# Altium footprint library LED.PcbLib: 71 footprints (part 4 of 5)
Each footprint in its own frame and in the unit in brackets; x right, y up, seen from the top. Pads: shape width x height; smd on the part's side, far side on the other; paste and mask are expansions set on the pad; w line width, h text height; cw(c..) or ccw(c..) is an arc to the next point about the centre after c.
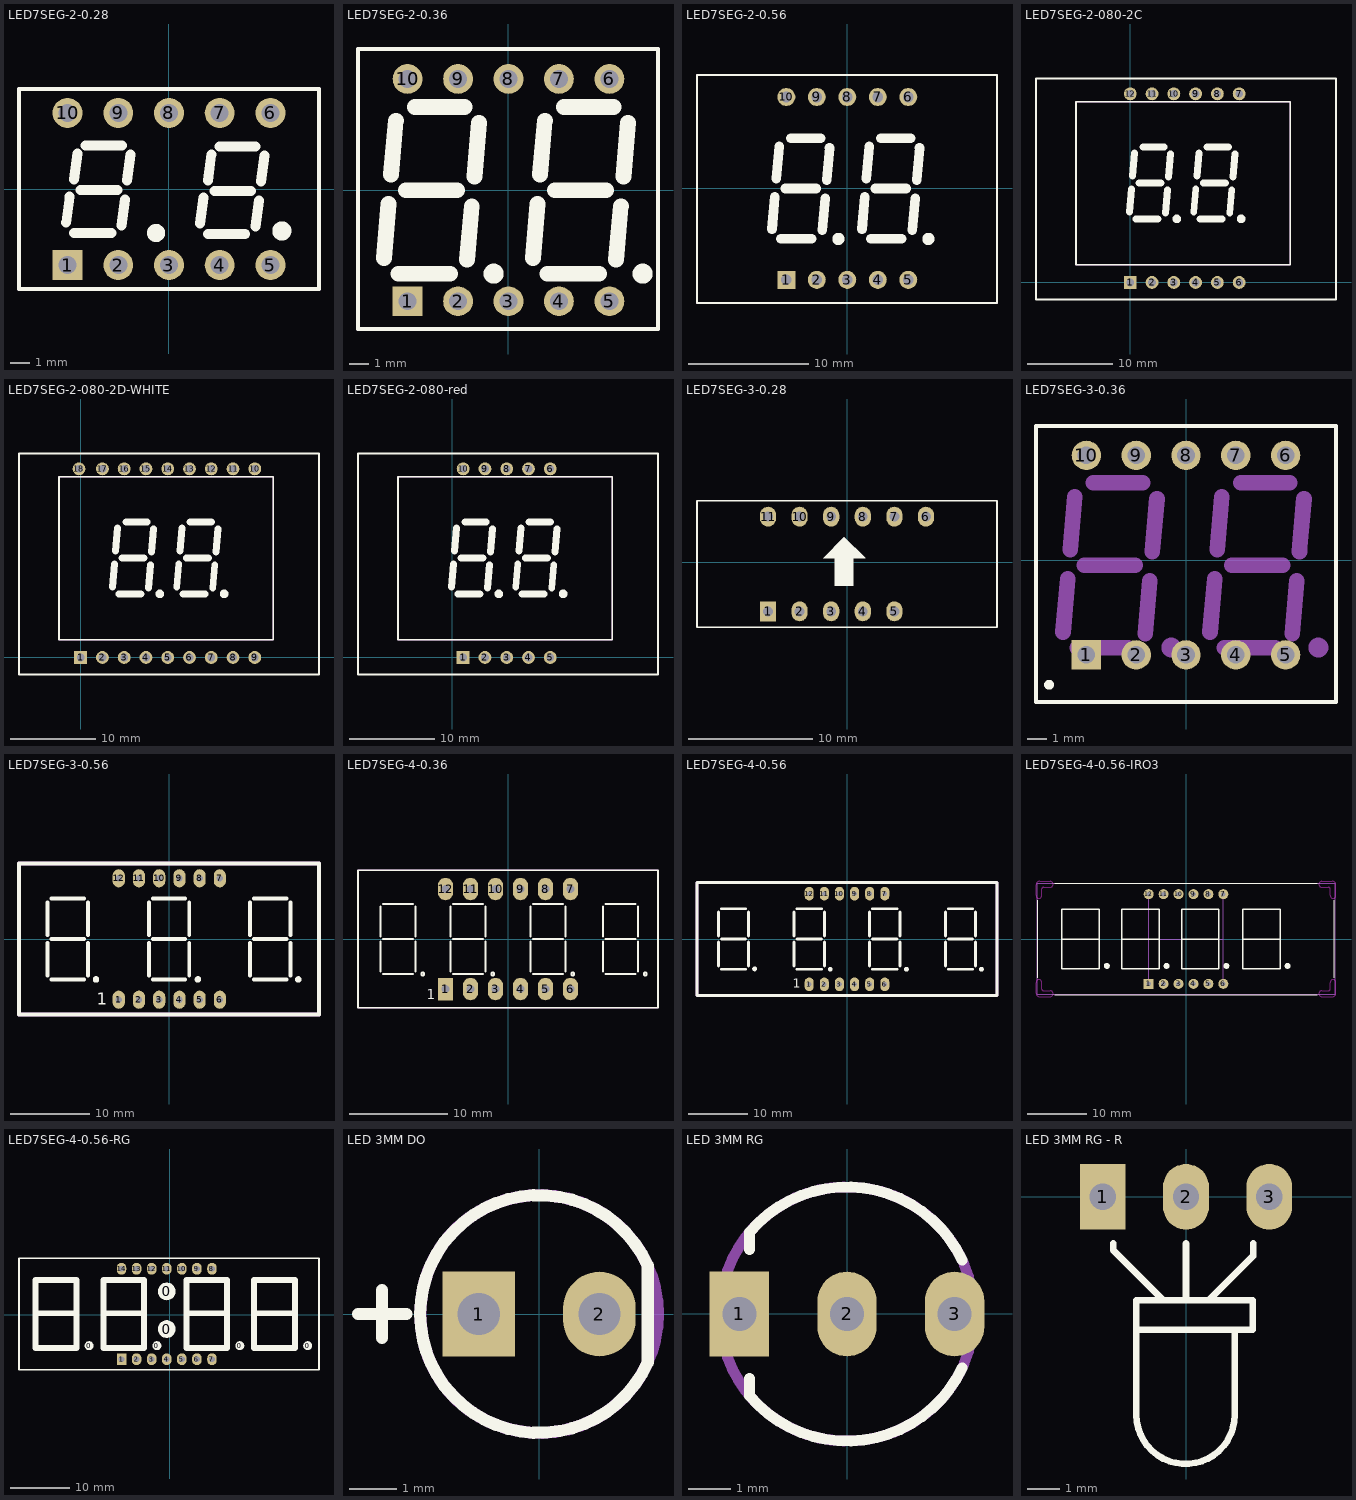
[diagram p3: the footprints below, top view; thin cyan lines are the x and y axes]

## LED7SEG-2-0.28 [mm] "LED, 7-Segment Display, 9.2 mm, Dual Digit; 10 Leads; Row Space 10.7 mm; Pitch 2.54 mm"
height 7.35
pads (10):
  rect 1.5x1.5 hole 0.9: 1(-5.08,-3.81)
  round 1.5 hole 0.9: 2(-2.54,-3.81) 3(0,-3.81) 4(2.54,-3.81) 5(5.08,-3.81) 6(5.08,3.81) 7(2.54,3.81) 8(0,3.81) 9(-2.54,3.81) 10(-5.08,3.81)
Top Overlay:
  circle w0.5: c5.65,-2.1 r0.23
  circle w0.5: c-0.65,-2.2 r0.206
  lines w0.2: -7.51,-5 7.51,-5 7.51,5 -7.51,5 -7.51,-5
  lines w0.5: -5.145,-1.675 -4.97,-0.375 ; -4.757,-2.2 -2.882,-2.2 ; -4.757,0.475 -4.582,1.775 ; -4.422,-0.05 -2.582,-0.05 ; -4.182,2.175 -2.357,2.175 ; -2.37,-1.825 -2.195,-0.525 ; -2.095,0.425 -1.92,1.725 ; 1.555,-1.725 1.73,-0.425 ; 1.943,-2.25 3.818,-2.25 ; 1.943,0.425 2.118,1.725 ; 2.278,-0.1 4.118,-0.1 ; 2.518,2.125 4.343,2.125 ; 4.33,-1.875 4.505,-0.575 ; 4.605,0.375 4.78,1.675
Mechanical 13:
  lines w0.2: -7.51,-5 -7.51,5 7.51,5 7.51,-5 -7.51,-5
  text ".Designator" at -3.95,-0.522 h2
3D body "User Library-LTD-2601G.STEP": height 6.1, standoff -3.5, extent -7.51,-5 7.51,5

## LED7SEG-2-0.36 [mm] "LED, 7-Segment Display, 9.2 mm, Dual Digit; 10 Leads; Row Space 10.7 mm; Pitch 2.54 mm"
height 7.35
pads (10):
  rect 1.5x1.5 hole 0.9: 1(-5.08,-5.596)
  round 1.5 hole 0.9: 2(-2.54,-5.596) 3(0,-5.596) 4(2.54,-5.596) 5(5.08,-5.596) 6(5.08,5.596) 7(2.54,5.596) 8(0,5.596) 9(-2.54,5.596) 10(-5.08,5.596)
Top Overlay:
  circle w0.75: c-0.747,-4.208 r0.13
  circle w0.75: c6.753,-4.208 r0.13
  lines w0.2: -7.575,-6.993 7.525,-6.993 7.525,7.104 -7.575,7.104 -7.575,-0.314 -7.575,-6.993
  lines w0.8: -6.275,-3.41 -6.038,-0.703 ; -5.909,0.794 -5.671,3.488 ; -5.541,-4.208 -2.949,-4.208 ; -5.172,-0.008 -2.582,-0.008 ; -4.714,4.192 -2.213,4.192 ; -2.084,-3.504 -1.847,-0.81 ; -1.715,0.694 -1.48,3.391 ; 1.225,-3.41 1.462,-0.703 ; 1.591,0.794 1.829,3.488 ; 1.959,-4.208 4.551,-4.208 ; 2.328,-0.008 4.918,-0.008 ; 2.786,4.192 5.287,4.192 ; 5.416,-3.504 5.653,-0.81 ; 5.785,0.694 6.02,3.391
Mechanical 13:
  lines w0.2: -7.575,-6.993 7.525,-6.993 7.525,7.104 -7.575,7.104 -7.575,-0.314 -7.575,-6.993
  text ".Desigantor" at -3.925,-0.422 h2
3D body "7 Segment Double Digit LED Display.STEP": height 7.02, standoff -4, extent -7.525,-6.985 7.475,7.025

## LED7SEG-2-0.56 [mm] "LED, 7-Segment Display, 9.2 mm, Dual Digit; 10 Leads; Row Space 10.7 mm; Pitch 2.54 mm"
height 7.35
pads (10):
  rect 1.5x1.5 hole 0.9: 1(-5.08,-7.62)
  round 1.5 hole 0.9: 2(-2.54,-7.62) 3(0,-7.62) 4(2.54,-7.62) 5(5.08,-7.62) 6(5.08,7.62) 7(2.54,7.62) 8(0,7.62) 9(-2.54,7.62) 10(-5.08,7.62)
Top Overlay:
  circle w0.75: c6.753,-4.208 r0.13
  circle w0.75: c-0.747,-4.208 r0.13
  lines w0.2: -12.525,-9.55 12.475,-9.55 12.475,9.45 -12.525,9.45 -12.525,-9.55
  lines w0.8: -6.275,-3.41 -6.038,-0.703 ; -5.909,0.794 -5.671,3.488 ; -5.541,-4.208 -2.949,-4.208 ; -5.172,-0.008 -2.582,-0.008 ; -4.714,4.192 -2.213,4.192 ; -2.084,-3.504 -1.847,-0.81 ; -1.715,0.694 -1.48,3.391 ; 1.225,-3.41 1.462,-0.703 ; 1.591,0.794 1.829,3.488 ; 1.959,-4.208 4.551,-4.208 ; 2.328,-0.008 4.918,-0.008 ; 2.786,4.192 5.287,4.192 ; 5.416,-3.504 5.653,-0.81 ; 5.785,0.694 6.02,3.391
Mechanical 13:
  lines w0.2: -12.525,-9.55 -12.525,-5.264 -12.525,9.45 12.475,9.45 12.475,-9.55 -12.525,-9.55
  text ".Desigantor" at -3.925,-0.422 h2
3D body "27763.stp": height 8, standoff -3.5, extent -0.102,-9.567 12.398,9.433
3D body "27763.stp": height 8, standoff -3.5, extent -12.623,-9.567 -0.123,9.433

## LED7SEG-2-080-2C [mm]
pads (12):
  rect 1.5x1.5 hole 0.9: 1(0,0)
  round 1.5 hole 0.9: 2(2.54,0) 3(5.08,0) 4(7.62,0) 5(10.16,0) 6(12.7,0) 7(12.7,22) 8(10.16,22) 9(7.62,22) 10(5.08,22) 11(2.54,22) 12(0,22)
Top Overlay:
  circle w0.75: c5.433,7.412 r0.13
  circle w0.75: c12.933,7.412 r0.13
  lines w0.2: -11,-2 24,-2 24,23.8 -11,23.8 -11,-2 ; -6.345,2.07 -6.345,21.07 18.655,21.07 18.655,2.07 -6.345,2.07
  lines w0.8: -0.095,8.21 0.142,10.917 ; 0.271,12.414 0.509,15.108 ; 0.639,7.412 3.231,7.412 ; 1.008,11.612 3.598,11.612 ; 1.466,15.812 3.967,15.812 ; 4.096,8.116 4.333,10.81 ; 4.465,12.314 4.7,15.011 ; 7.405,8.21 7.642,10.917 ; 7.771,12.414 8.009,15.108 ; 8.139,7.412 10.731,7.412 ; 8.508,11.612 11.098,11.612 ; 8.966,15.812 11.467,15.812 ; 11.596,8.116 11.833,10.81 ; 11.965,12.314 12.2,15.011
Mechanical 13:
  lines w0.2: -6.345,2.07 18.655,2.07 18.655,21.07 -6.345,21.07 -6.345,6.356 -6.345,2.07
  text ".Desigantor" at 2.255,11.198 h2
3D body: height 10, standoff 0, extent -11,-2 24,23.8
3D body "27763.stp": height 8, standoff -3.5, extent -6.443,2.053 6.057,21.053
3D body "27763.stp": height 8, standoff -3.5, extent 6.078,2.053 18.578,21.053

## LED7SEG-2-080-2D-WHITE [mm]
pads (18):
  rect 1.5x1.5 hole 0.9: 1(0,0)
  round 1.5 hole 0.9: 2(2.54,0) 3(5.08,0) 4(7.62,0) 5(10.16,0) 6(12.7,0) 7(15.24,0) 8(17.78,0) 9(20.32,0) 10(20.32,22) 11(17.78,22) 12(15.24,22) 13(12.7,22) 14(10.16,22) 15(7.62,22) 16(5.08,22) 17(2.54,22) 18(-0.193,22)
Top Overlay:
  circle w0.75: c9.243,7.412 r0.13
  circle w0.75: c16.743,7.412 r0.13
  lines w0.2: -7.19,-2 27.81,-2 27.81,23.8 -7.19,23.8 -7.19,-2 ; -2.535,2.07 -2.535,21.07 22.465,21.07 22.465,2.07 -2.535,2.07
  lines w0.8: 3.715,8.21 3.952,10.917 ; 4.081,12.414 4.319,15.108 ; 4.449,7.412 7.041,7.412 ; 4.818,11.612 7.408,11.612 ; 5.276,15.812 7.777,15.812 ; 7.906,8.116 8.143,10.81 ; 8.275,12.314 8.51,15.011 ; 11.215,8.21 11.452,10.917 ; 11.581,12.414 11.819,15.108 ; 11.949,7.412 14.541,7.412 ; 12.318,11.612 14.908,11.612 ; 12.776,15.812 15.277,15.812 ; 15.406,8.116 15.643,10.81 ; 15.775,12.314 16.01,15.011
Mechanical 13:
  lines w0.2: -2.535,2.07 22.465,2.07 22.465,21.07 -2.535,21.07 -2.535,6.356 -2.535,2.07
  text ".Desigantor" at 6.065,11.198 h2
3D body: height 10, standoff 0, extent -7.19,-2 27.81,23.8
3D body "27763.stp": height 8, standoff -3.5, extent -2.633,2.053 9.867,21.053
3D body "27763.stp": height 8, standoff -3.5, extent 9.888,2.053 22.388,21.053

## LED7SEG-2-080-red [mm]
pads (10):
  rect 1.5x1.5 hole 0.9: 1(1.27,0)
  round 1.5 hole 0.9: 2(3.81,0) 3(6.35,0) 4(8.89,0) 5(11.43,0) 6(11.43,22) 7(8.89,22) 8(6.35,22) 9(3.81,22) 10(1.27,22)
Top Overlay:
  circle w0.75: c12.933,7.412 r0.13
  circle w0.75: c5.433,7.412 r0.13
  lines w0.2: -11,-2 -11,23.8 24,23.8 24,-2 -11,-2 ; -6.345,2.07 18.655,2.07 18.655,21.07 -6.345,21.07 -6.345,2.07
  lines w0.8: -0.095,8.21 0.142,10.917 ; 0.271,12.414 0.509,15.108 ; 0.639,7.412 3.231,7.412 ; 1.008,11.612 3.598,11.612 ; 1.466,15.812 3.967,15.812 ; 4.096,8.116 4.333,10.81 ; 4.465,12.314 4.7,15.011 ; 7.405,8.21 7.642,10.917 ; 7.771,12.414 8.009,15.108 ; 8.139,7.412 10.731,7.412 ; 8.508,11.612 11.098,11.612 ; 8.966,15.812 11.467,15.812 ; 11.596,8.116 11.833,10.81 ; 11.965,12.314 12.2,15.011
Mechanical 13:
  lines w0.2: -6.345,2.07 -6.345,6.356 -6.345,21.07 18.655,21.07 18.655,2.07 -6.345,2.07
  text ".Desigantor" at 2.255,11.198 h2
3D body "27763.stp": height 8, standoff -3.5, extent 6.078,2.053 18.578,21.053
3D body "27763.stp": height 8, standoff -3.5, extent -6.443,2.053 6.057,21.053
3D body: height 10, standoff 0, extent -11,-2 24,23.8

## LED7SEG-3-0.28 [mil]
height 300
pads (11):
  rect 51.18x62.99 hole 31: 1(-250,-155)
  oval 51.18x62.99 hole 31: 2(-150,-155) 3(-50,-155) 4(50,-155) 5(150,-155) 6(250,145) 7(150,145) 8(50,145) 9(-50,145) 10(-150,145) 11(-250,145)
Top Overlay:
  region: -76,14 -10,80 -8,80 57,15 57,14 20,14 20,-74 -39,-74 -39,14
  lines w5: -475,-205 -475,195 475,195 475,-205 -475,-205
3D body "User Library-IND GNT-2831BD.step": height -157.48, standoff -524.02, extent -472.44,-202.24 472.44,191.85
3D body "61300511821.stp": height 335.04, standoff -121.65, extent -309.84,-205 209.84,-106.57
3D body "61300611821.stp": height 335.04, standoff -121.65, extent -309.84,95.79 309.85,194.22

## LED7SEG-3-0.36 [mm]
height 7.35
pads (10):
  rect 1.5x1.5 hole 0.9: 1(-5.08,-4.826)
  round 1.5 hole 0.9: 2(-2.54,-4.826) 3(0,-4.826) 4(2.54,-4.826) 5(5.08,-4.826) 6(5.08,5.35) 7(2.54,5.35) 8(0,5.35) 9(-2.54,5.35) 10(-5.08,5.35)
Top Overlay:
  circle w0.25: c-6.985,-6.35 r0.125
  lines w0.2: -7.65,-7.239 -7.65,-0.635 -7.65,6.858 7.65,6.858 7.65,-7.239 -7.65,-7.239
Mechanical 1:
  circle w0.75: c-0.747,-4.454 r0.13
  circle w0.75: c6.753,-4.454 r0.13
  lines w0.8: -6.275,-3.656 -6.038,-0.949 ; -5.909,0.547 -5.671,3.242 ; -5.541,-4.454 -2.949,-4.454 ; -5.172,-0.254 -2.582,-0.254 ; -4.714,3.946 -2.213,3.946 ; -2.084,-3.75 -1.847,-1.056 ; -1.715,0.448 -1.48,3.145 ; 1.225,-3.656 1.462,-0.949 ; 1.591,0.547 1.829,3.242 ; 1.959,-4.454 4.551,-4.454 ; 2.328,-0.254 4.918,-0.254 ; 2.786,3.946 5.287,3.946 ; 5.416,-3.75 5.653,-1.056 ; 5.785,0.448 6.02,3.145
3D body "61300511821.stp": height 8.51, standoff -3.09, extent -6.6,4.1 6.6,6.6
3D body "61300511821.stp": height 8.51, standoff -3.09, extent -6.6,-6.076 6.6,-3.576
3D body "SD-3361_X.SLDPRT": height 12, standoff -1.3, extent -9.98,-6.746 12.52,7.254

## LED7SEG-3-0.56 [mil]
height 300
pads (12):
  oval 60x90 hole 31: 1(-250,-300) 2(-150,-300) 3(-50,-300) 4(50,-300) 5(150,-300) 6(250,-300) 7(250,300) 8(150,300) 9(50,300) 10(-50,300) 11(-150,300) 12(-250,300)
Top Overlay:
  circle w19.68: c-362.39,-200 r6
  circle w19.68: c141.61,-200 r6
  circle w19.68: c637.61,-200 r6
  lines w19.68: -601.39,-180 -601.39,-20 ; -601.39,-180 -601.39,-20 ; -601.39,-180 -601.39,-20 ; -601.39,-180 -601.39,-20 ; -601.39,20 -601.39,180 ; -601.39,20 -601.39,180 ; -601.39,20 -601.39,180 ; -601.39,20 -601.39,180 ; -581.39,0 -421.39,0 ; -581.39,0 -421.39,0 ; -581.39,0 -421.39,0 ; -581.39,0 -421.39,0 ; -401.39,-180 -401.39,-20 ; -401.39,-180 -401.39,-20 ; -401.39,-180 -401.39,-20 ; -401.39,-180 -401.39,-20 ; -401.39,20 -401.39,180 ; -401.39,20 -401.39,180 ; -401.39,20 -401.39,180 ; -401.39,20 -401.39,180 ; -101.39,-180 -101.39,-20 ; -101.39,-180 -101.39,-20 ; -101.39,-180 -101.39,-20 ; -101.39,-180 -101.39,-20 ; -101.39,-180 -101.39,-20 ; -101.39,-180 -101.39,-20 ; -101.39,-180 -101.39,-20 ; -101.39,-180 -101.39,-20 ; -101.39,20 -101.39,180 ; -101.39,20 -101.39,180 ; -101.39,20 -101.39,180 ; -101.39,20 -101.39,180 ; -101.39,20 -101.39,180 ; -101.39,20 -101.39,180 ; -101.39,20 -101.39,180 ; -101.39,20 -101.39,180 ; -81.39,-200 78.61,-200 ; -81.39,-200 78.61,-200 ; -81.39,-200 78.61,-200 ; -81.39,-200 78.61,-200 ; -81.39,0 78.61,0 ; -81.39,0 78.61,0 ; -81.39,0 78.61,0 ; -81.39,0 78.61,0 ; -81.39,0 78.61,0 ; -81.39,0 78.61,0 ; -81.39,0 78.61,0 ; -81.39,0 78.61,0 ; -81.39,200 78.61,200 ; -81.39,200 78.61,200 ; -81.39,200 78.61,200 ; -81.39,200 78.61,200 ; 98.61,-180 98.61,-20 ; 98.61,-180 98.61,-20 ; 98.61,-180 98.61,-20 ; 98.61,-180 98.61,-20 ; 98.61,-180 98.61,-20 ; 98.61,-180 98.61,-20 ; 98.61,-180 98.61,-20 ; 98.61,-180 98.61,-20 ; 98.61,20 98.61,180 ; 98.61,20 98.61,180 ; 98.61,20 98.61,180 ; 98.61,20 98.61,180 ; 98.61,20 98.61,180 ; 98.61,20 98.61,180 ; 98.61,20 98.61,180 ; 98.61,20 98.61,180 ; 398.61,-180 398.61,-20 ; 398.61,-180 398.61,-20 ; 398.61,-180 398.61,-20 ; 398.61,-180 398.61,-20 ; 398.61,-180 398.61,-20 ; 398.61,-180 398.61,-20 ; 398.61,-180 398.61,-20 ; 398.61,-180 398.61,-20 ; 398.61,20 398.61,180 ; 398.61,20 398.61,180 ; 398.61,20 398.61,180 ; 398.61,20 398.61,180 ; 398.61,20 398.61,180 ; 398.61,20 398.61,180 ; 398.61,20 398.61,180 ; 398.61,20 398.61,180 ; 418.61,-200 578.61,-200 ; 418.61,-200 578.61,-200 ; 418.61,-200 578.61,-200 ; 418.61,-200 578.61,-200 ; 418.61,0 578.61,0 ; 418.61,0 578.61,0 ; 418.61,0 578.61,0 ; 418.61,0 578.61,0 ; 418.61,0 578.61,0 ; 418.61,0 578.61,0 ; 418.61,0 578.61,0 ; 418.61,0 578.61,0 ; 418.61,200 578.61,200 ; 418.61,200 578.61,200 ; 418.61,200 578.61,200 ; 418.61,200 578.61,200 ; 598.61,-180 598.61,-20 ; 598.61,-180 598.61,-20 ; 598.61,-180 598.61,-20 ; 598.61,-180 598.61,-20 ; 598.61,-180 598.61,-20 ; 598.61,-180 598.61,-20 ; 598.61,-180 598.61,-20 ; 598.61,-180 598.61,-20 ; 598.61,20 598.61,180 ; 598.61,20 598.61,180 ; 598.61,20 598.61,180 ; 598.61,20 598.61,180 ; 598.61,20 598.61,180 ; 598.61,20 598.61,180 ; 598.61,20 598.61,180 ; 598.61,20 598.61,180 ; -743.11,-374 -743.11,374 740.16,374 740.16,-374 -743.11,-374 ; -581.39,-200 -421.39,-200 -581.39,-200 ; -581.39,200 -421.39,200 -581.39,200
  text "1" at -358,-324 h60
Mechanical 13:
  lines w19.68: -743.11,-374 740.16,-374 740.16,374 -743.11,374 -743.11,-374
  text ".Designator" at -349,-47 h118.11
Mechanical 15:
  lines w19.68: -743.11,-374 740.16,-374 740.16,374 -743.11,374 -743.11,-374
  text ".Comment" at -351,-22 h118.11
3D body "User Library-King Bright BX56-11.STEP": height 314.96, standoff -161.42, extent -740.15,-374.01 740.16,374.02

## LED7SEG-4-0.36 [mil]
height 300
pads (12):
  rect 60x90 hole 31: 1(-250,-200)
  oval 60x90 hole 31: 2(-150,-200) 3(-50,-200) 4(50,-200) 5(150,-200) 6(250,-200) 7(250,200) 8(150,200) 9(50,200) 10(-50,200) 11(-150,200) 12(-250,200)
Top Overlay:
  circle w7.87: c-61,-140 r6
  circle w7.87: c-341,-140 r6
  circle w7.87: c549,-140 r6
  circle w7.87: c259,-140 r6
  lines w7.87: -510,-130 -510,-10 ; -510,10 -510,130 ; -500,-140 -380,-140 ; -500,140 -380,140 ; -370,-130 -370,-10 ; -370,10 -370,130 ; -230,-130 -230,-10 ; -230,10 -230,130 ; -220,-140 -100,-140 ; -220,140 -100,140 ; -90,-130 -90,-10 ; -90,10 -90,130 ; 90,-130 90,-10 ; 90,10 90,130 ; 100,-140 220,-140 ; 100,140 220,140 ; 230,-130 230,-10 ; 230,10 230,130 ; 380,-130 380,-10 ; 380,10 380,130 ; 390,-140 510,-140 ; 390,140 510,140 ; 520,-130 520,-10 ; 520,10 520,130 ; -600,-275 600,-275 600,275 -600,275 -600,-275 ; -500,0 -380,0 -500,0 ; -220,0 -100,0 -220,0 ; 100,0 220,0 100,0 ; 390,0 510,0 390,0
  text "1" at -325,-240 h39.37
Mechanical 13:
  lines w7.87: -600,-275 600,-275 600,275 -600,275 -600,-275
  text ".Designator" at -218,-50 h118.11
Mechanical 15:
  lines w7.87: -600,-275 -600,275 600,275 600,-275 -600,-275
  text ".Comment" at -217,-30 h118.11
3D body "User Library-IND 3641 RED.step": height 283.86, standoff -263.78, extent -590.1,-274.18 591,277

## LED7SEG-4-0.56 [mil]
height 300
pads (12):
  oval 60x90 hole 31: 1(-250,-300) 2(-150,-300) 3(-50,-300) 4(50,-300) 5(150,-300) 6(250,-300) 7(250,300) 8(150,300) 9(50,300) 10(-50,300) 11(-150,300) 12(-250,300)
Top Overlay:
  drawing of 152 lines, arcs and shapes, not listed
  text "1" at -358,-324 h60
Mechanical 13:
  lines w19.68: -992,-374 -992,374 992,374 992,-374 -992,-374
  text ".Designator" at -349,-47 h118.11
Mechanical 15:
  lines w19.68: -992,-374 -992,374 992,374 992,-374 -992,-374
  text ".Comment" at -351,-22 h118.11
3D body "User Library-C-564 (7 segment 4 digit LED display).step": height 314.96, standoff -244.09, extent -992.12,-374.01 992.13,374.02

## LED7SEG-4-0.56-IRO3 [mm] "LED 7SEG 4DIGIT"
height 7.62
pads (12):
  rect 1.7x1.7 hole 0.8: 1(-6.35,-7.62)
  round 1.7 hole 0.8: 2(-3.81,-7.62) 3(-1.27,-7.62) 4(1.27,-7.62) 5(3.81,-7.62) 6(6.35,-7.62) 7(6.35,7.62) 8(3.81,7.62) 9(1.27,7.62) 10(-1.27,7.62) 11(-3.81,7.62) 12(-6.35,7.62)
Top Overlay:
  circle w0.508: c-13.462,-4.572 r0.254
  circle w0.508: c-3.302,-4.572 r0.254
  circle w0.508: c6.858,-4.572 r0.254
  circle w0.508: c17.272,-4.572 r0.254
  lines w0.2: -25.2,-6.6 -25.2,6.6 ; -22.3,-9.5 22.3,-9.5 ; -22.3,9.5 22.3,9.5 ; 25.2,-6.6 25.2,6.6
  lines w0.254: -21.082,0 -14.732,0 ; -10.922,0 -4.572,0 ; -0.762,0 5.588,0 ; 9.652,0 16.002,0 ; -21.082,-5.08 -14.732,-5.08 -14.732,5.08 -21.082,5.08 -21.082,-5.08 ; -10.922,-5.08 -10.922,5.08 -4.572,5.08 -4.572,-5.08 -10.922,-5.08 ; -0.762,-5.08 -0.762,5.08 5.588,5.08 5.588,-5.08 -0.762,-5.08 ; 9.652,-5.08 9.652,5.08 16.002,5.08 16.002,-5.08 9.652,-5.08
Keep-Out Layer:
  lines w0.2: -25.5,-9.2 ccw(c-24.9,-9.2) -24.9,-9.8 -23.1,-9.8 ccw(c-23.1,-9.3) -23.1,-8.8 -24.2,-8.8 cw(c-24.2,-8.5) -24.5,-8.5 -24.5,-7.4 ccw(c-25,-7.4) -25.5,-7.4 -25.5,-9.2 ; -25.5,7.4 ccw(c-25,7.4) -24.5,7.4 -24.5,8.5 cw(c-24.2,8.5) -24.2,8.8 -23.1,8.8 ccw(c-23.1,9.3) -23.1,9.8 -24.9,9.8 ccw(c-24.9,9.2) -25.5,9.2 -25.5,7.4 ; 23.1,-9.8 cw(c23.1,-9.3) 23.1,-8.8 24.2,-8.8 ccw(c24.2,-8.5) 24.5,-8.5 24.5,-7.4 cw(c25,-7.4) 25.5,-7.4 25.5,-9.2 cw(c24.9,-9.2) 24.9,-9.8 23.1,-9.8 ; 23.1,8.8 cw(c23.1,9.3) 23.1,9.8 24.9,9.8 cw(c24.9,9.2) 25.5,9.2 25.5,7.4 cw(c25,7.4) 24.5,7.4 24.5,8.5 ccw(c24.2,8.5) 24.2,8.8 23.1,8.8
Mechanical 1:
  lines w0.2: -6.35,-7.62 -6.35,7.62 ; -6.35,0 6.35,0 ; 6.35,-7.62 6.35,7.62
Mechanical 13:
  lines w0.2: -25.3,-9.375 25.35,-9.375 25.35,9.475 -25.3,9.475 -25.3,-9.375
  text ".Designator" at -4.525,-0.297 h2
3D body "User Library-C-564 (7 segment 4 digit LED display).step": height 7.05, standoff -7.15, extent -25.2,-9.5 25.2,9.5

## LED7SEG-4-0.56-RG [mil]
pads (20):
  round 60 on Top Overlay: 0(-535,-205) 0(-85,-205) 0(465,-205) 0(915,-205)
  round 118.11 on Top Overlay: 0(-20,-95) 0(-20,155)
  rect 62.99x78.74 hole 39.37: 1(-320,-295)
  oval 62.99x78.74 hole 39.37: 2(-220,-295) 3(-120,-295) 4(-20,-295) 5(80,-295) 6(180,-295) 7(280,-295) 8(280,305) 9(180,305) 10(80,305) 11(-20,305) 12(-120,305) 13(-220,305) 14(-320,305)
Top Overlay:
  lines w10: -1000,-365 990,-365 990,375 -1000,375 -1000,-365
  lines w39.37: -885,10 -620,10 ; -435,10 -170,10 ; 115,10 380,10 ; 565,10 830,10 ; -890,-220 -620,-220 -620,230 -890,230 -890,-220 ; -440,-220 -170,-220 -170,230 -440,230 -440,-220 ; 110,-220 380,-220 380,230 110,230 110,-220 ; 560,-220 830,-220 830,230 560,230 560,-220
3D body "SOCKET6.stp": height 276.19, standoff -117.51, extent -325,260 275,360
3D body "SOCKET6.stp": height 276.19, standoff -117.51, extent -325,-334.99 275,-234.99
3D body "7seg2-4.STEP": height 564.96, standoff 112.2, extent -995.16,-370 985.16,378.03

## LED 3MM DO [mil]
pads (2):
  rect 60x70 hole 35: 1(-50,0)
  oval 60x70 hole 35: 2(50,0)
Top Overlay:
  lines w10: -150,0 -110,0 -140,0 ; -130,-20 -130,20 ; 90,-40 cw(c0,0) 90,40 90,-40
Mechanical 13:
  circle w10: c0,0 r98.49
  text ".Designator" at -73.49,-20.11 h78.74
3D body "User Library-LED-D3R.step": height 181.1, standoff -255.91, extent -77.18,-77.48 67.18,80

## LED 3MM RG [mm]
pads (3):
  rect 1.4x2 hole 0.8 mask+0.102: 1(-2.54,0)
  oval 1.4x2 hole 0.8 mask+0.102: 2(0,0) 3(2.54,0)
Top Overlay:
  lines w0.254: -2.298,-1.524 -2.298,-1.929 ccw(c0,0) 2.719,-1.268 ; -2.298,1.524 -2.298,1.928 cw(c0,0) 2.719,1.268
Mechanical 13:
  circle w0.254: c0,0 r3
  text ".Designator" at -2.54,-0.622 h2
3D body "everlight-3MM-LED-RG.step": height 6.77, standoff -2.9, extent -2.74,-1.9 2.74,1.9

## LED 3MM RG - R [mm]
pads (3):
  rect 1.4x2 hole 0.8 mask+0.102: 1(-2.54,0)
  oval 1.4x2 hole 0.8 mask+0.102: 2(0,0) 3(2.54,0)
Top Overlay:
  lines w0.2: -2.225,-1.425 -2.225,-1.626 -0.7,-3.151 ; 0,-3.151 0,-1.425 ; 0.7,-3.151 2.045,-1.806 2.045,-1.425 ; -1.513,-4.051 1.487,-4.051 ; -1.513,-4.051 -1.513,-6.651 ccw(c-0.013,-6.651) 1.487,-6.651 1.487,-4.051 ; -1.513,-4.051 -1.513,-3.151 2.032,-3.151 2.032,-4.051 1.487,-4.051
Mechanical 13:
  text ".Designator" at -2.54,-0.622 h2
3D body "everlight-3MM-LED-RG.step": height 4, standoff 0.2, extent -2.74,-8.151 2.74,1.524